# Altium footprint library AMAP4BPXEVBv2.PcbLib: 66 footprints (part 5 of 5)
Each footprint in its own frame and in the unit in brackets; x right, y up, seen from the top. Pads: shape width x height; smd on the part's side, far side on the other; paste and mask are expansions set on the pad; w line width, h text height; cw(c..) or ccw(c..) is an arc to the next point about the centre after c.
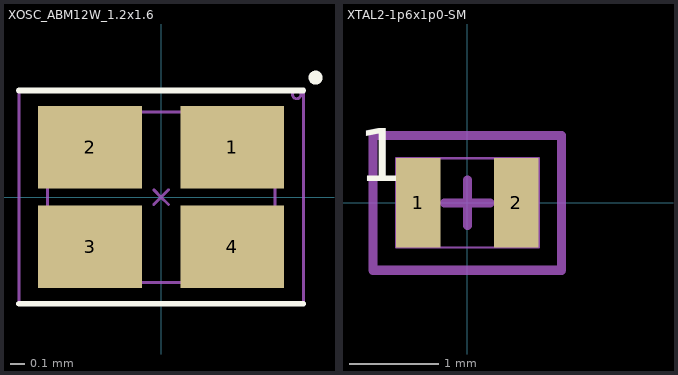
[diagram p4: the footprints below, top view; thin cyan lines are the x and y axes]

## XOSC_ABM12W_1.2x1.6 [mm] "Footprint for the ABM12W series of Xtal oscilators"
height 0.4
pads (4):
  rect 0.73x0.58 smd mask+0.03: 1(0.5,0.35) 2(-0.5,0.35) 3(-0.5,-0.35) 4(0.5,-0.35)
Top Overlay:
  circle w0.05: c1.086,0.841 r0.024
  lines w0.04: -1,-0.75 1,-0.75 ; -1,0.75 1,0.75
Top Assembly:
  circle w0.02: c0.953,0.722 r0.029
  lines w0.02: -0.8,-0.6 -0.8,0.6 0.8,0.6 0.8,-0.6 -0.8,-0.6
  text ".Designator" at -0.279,-0.059 h0.5
Top Courtyard:
  lines w0.02: -1,-0.75 -1,0.75 1,0.75 1,-0.75 -1,-0.75
Top Component Center:
  lines w0.02: -0.052,-0.052 0,0 ; -0.052,0.052 0,0 ; 0.052,-0.052 0,0 ; 0.052,0.052 0,0
3D body "ABM12W.STEP": height 0.4, standoff 0, extent -0.8,-0.6 0.8,0.6

## XTAL2-1p6x1p0-SM [mm] "XTAL2-1P6X1P0-SM"
pads (2):
  rect 0.5x1.001 smd: 1(-0.549,0) 2(0.549,0)
Top Overlay:
  text "1" at -1.224,0.049 h1.02
Top Assembly:
  lines w0.025: -0.8,-0.5 0.8,-0.5 0.8,0.5 -0.8,0.5 -0.8,-0.5
  text "2" at 0.884,-0.481 h1.02
  text "1" at -1.158,-0.49 h1.02
  text ".Designator" at 0.158,-2.28 h1.02
Top Courtyard:
  lines w0.102: -1.054,-0.754 -1.054,0.754 1.054,0.754 1.054,-0.754 -1.054,-0.754
Top Component Center:
  lines w0.102: -0.254,0 0.254,0 ; 0,-0.254 0,0.254
3D body: height 0.4, standoff 0, extent -0.8,-0.5 0.8,0.5